# Altium footprint library THT_Bauteile.PcbLib: 59 footprints (part 3 of 4)
Each footprint in its own frame and in the unit in brackets; x right, y up, seen from the top. Pads: shape width x height; smd on the part's side, far side on the other; paste and mask are expansions set on the pad; w line width, h text height; cw(c..) or ccw(c..) is an arc to the next point about the centre after c.
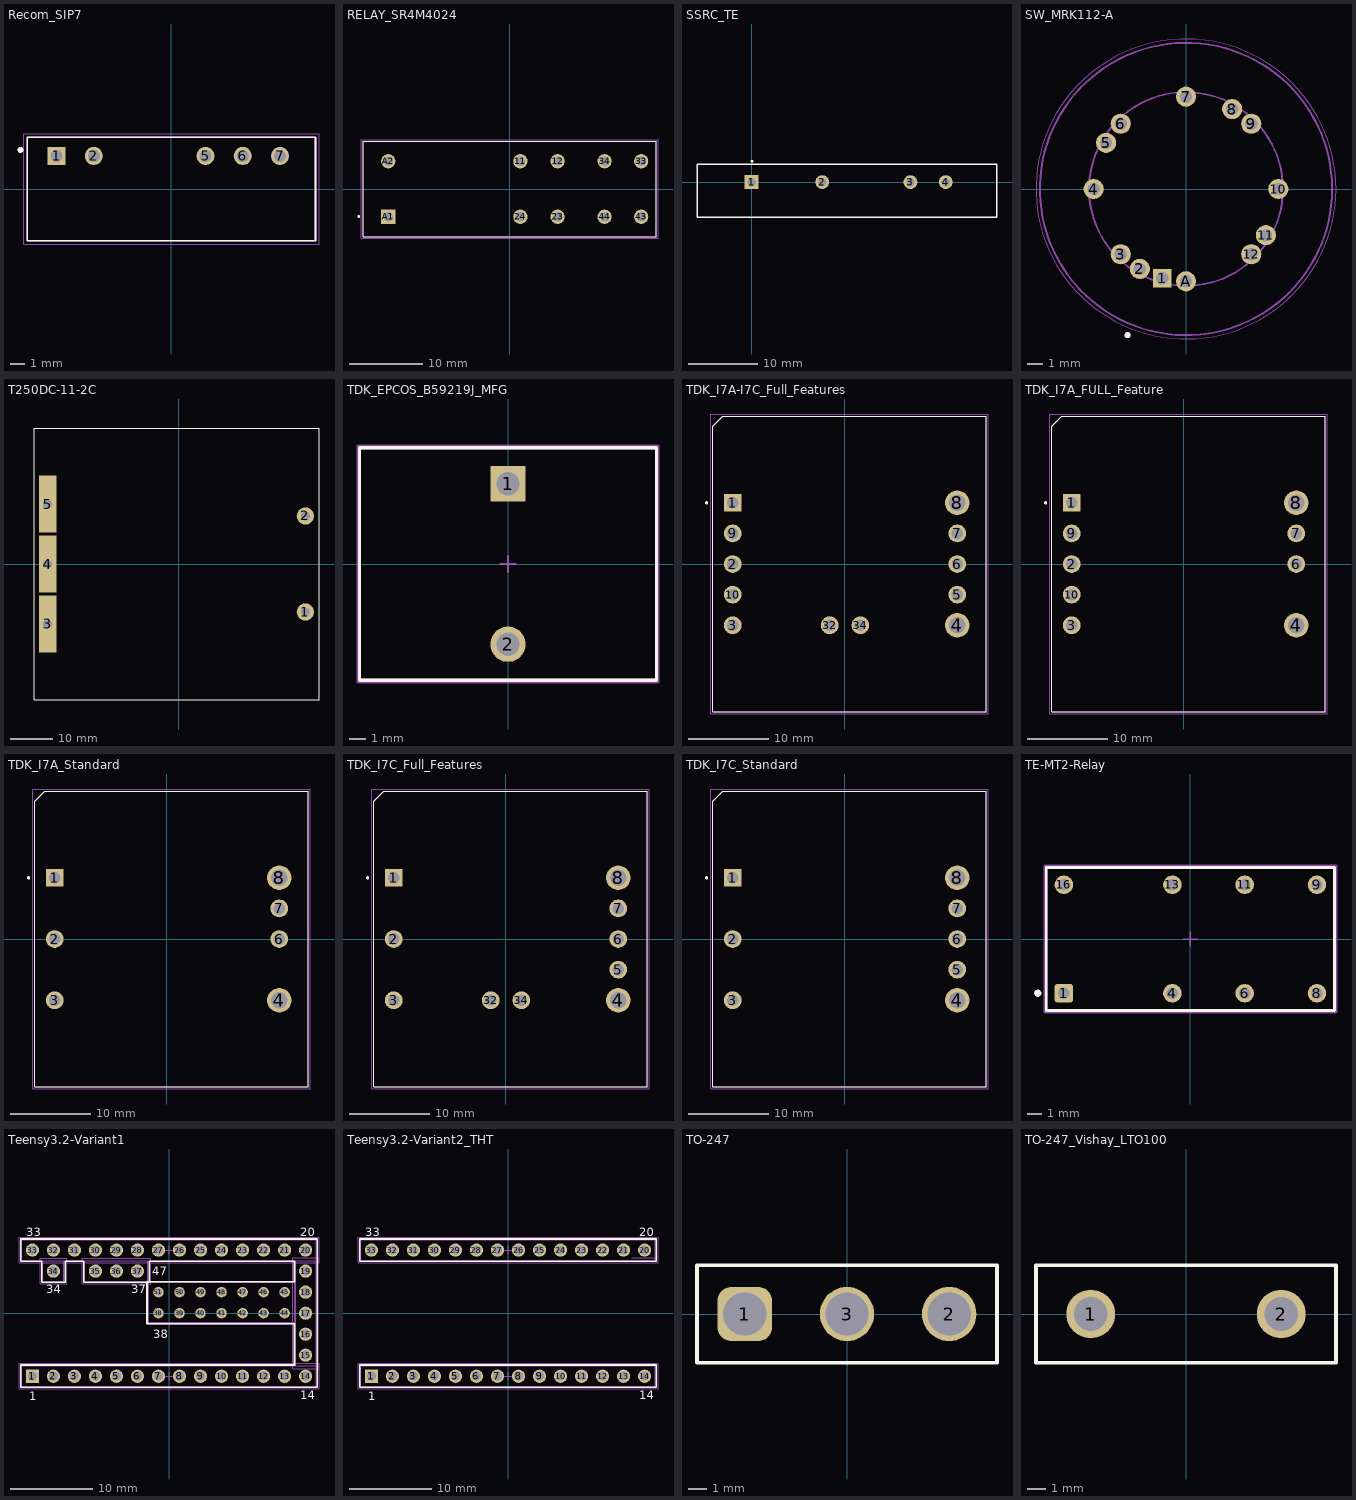
[diagram p2: the footprints below, top view; thin cyan lines are the x and y axes]

## Recom_SIP7 [mm]
height 10.2
pads (5):
  rect 1.23x1.23 hole 0.82: 1(-7.825,2.255)
  round 1.23 hole 0.82: 2(-5.285,2.255) 5(2.335,2.255) 6(4.875,2.255) 7(7.415,2.255)
Top Overlay:
  circle w0.2: c-10.287,2.667 r0.1
  lines w0.127: -9.825,-3.525 -9.825,3.525 9.825,3.525 9.825,-3.525 -9.825,-3.525
Mechanical 4:
  circle w0.2: c-10.287,2.667 r0.1
  circle w0.2: c-10.287,2.667 r0.1
  lines w0.127: -9.825,-3.525 -9.825,3.525 ; -9.825,-3.525 9.825,-3.525 ; -9.825,-3.525 -9.825,3.525 ; -9.825,-3.525 9.825,-3.525 ; -9.825,3.525 9.825,3.525 ; -9.825,3.525 9.825,3.525 ; 9.825,-3.525 9.825,3.525 ; 9.825,-3.525 9.825,3.525
Mechanical 16:
  lines w0.05: -10.075,-3.775 -10.075,3.775 10.075,3.775 10.075,-3.775 -10.075,-3.775
3D body "Recom_RKZE_D.step": height 10.2, standoff -4.1, extent -9.825,-3.525 9.825,3.525

## RELAY_SR4M4024 [mm]
pads (10):
  round 1.95 hole 1.3: 11(1.45,3.8) 12(6.54,3.8) 23(6.54,-3.8) 24(1.45,-3.8) 33(17.95,3.8) 34(12.95,3.8) 43(17.95,-3.8) 44(12.95,-3.8) A2(-16.6,3.8)
  rect 1.95x1.95 hole 1.3: A1(-16.6,-3.8)
Top Overlay:
  circle w0.2: c-20.627,-3.75 r0.1
  lines w0.127: -20,-6.5 20,-6.5 20,6.5 -20,6.5 -20,-6.5
Mechanical 13:
  lines w0.127: -20,-6.5 20,-6.5 20,6.5 -20,6.5 -20,-6.5
Mechanical 15:
  lines w0.05: -20.25,-6.75 20.25,-6.75 20.25,6.75 -20.25,6.75 -20.25,-6.75

## SSRC_TE [mm] "5A SIP Solid State Relay  With Paired SCR Output of TE"
height 26.67
pads (4):
  rect 2x2 hole 1.2: 1(0,0)
  round 2 hole 1.2: 2(10.16,0) 3(22.86,0) 4(27.94,0)
Top Overlay:
  circle w0.2: c0.025,3 r0.1
  lines w0.2: -7.875,-5.075 -7.875,2.55 35.325,2.55 35.325,-5.075 -7.875,-5.075
3D body "c-6-1393030-1-a-3d.stp": height 26.67, standoff -6.35, extent -7.874,-5.08 35.306,2.54

## SW_MRK112-A [mm]
pads (13):
  rect 1.2x1.2 hole 0.8: 1(-1.553,-5.796)
  round 1.308 hole 0.8: 2(-3,-5.196) 3(-4.243,-4.243) 4(-6,0) 5(-5.196,3) 6(-4.243,4.243) 7(0,6) 8(3,5.196) 9(4.243,4.243) 10(6,0) 11(5.196,-3) 12(4.243,-4.243) A(0,-6)
Top Overlay:
  circle w0.2: c-3.8,-9.5 r0.1
Mechanical 13:
  circle w0.127: c0,0 r6.3
  circle w0.2: c-3.8,-9.5 r0.1
  circle w0.127: c0,0 r9.5
Mechanical 15:
  circle w0.05: c0,0 r9.75
3D body "MRK112-A.stp": height 28.84, standoff -3.78, extent -9.487,-9.5 9.487,9.5

## T250DC-11-2C [mm] "Planar Transformer Footprint"
pads (5):
  round 4.1 hole 2.1: 1(30.106,-11.43) 2(30.106,11.43)
  rect 4.2x13.6 hole 2.2 square: 3(-31.193,-14.25) 4(-31.193,0) 5(-31.193,14.25)
Top Overlay:
  lines w0.2: -34.35,-32.25 -34.35,32.25 33.35,32.25 33.35,-32.25 -34.35,-32.25
3D body "63261R00-3D(04.02.24).stp": height 34, standoff -4, extent -34.348,-32.25 33.353,32.25

## TDK_EPCOS_B59219J_MFG [mm] "PTC thermistors as inrush current limiters"
height 22.7
pads (2):
  rect 2.2x2.2 hole 1.45 paste-2539.97 mask+0: 1(0,5)
  round 2.2 hole 1.45 paste-2539.97 mask+0: 2(0,-5)
Top Overlay:
  lines w0.2: -9.25,-7.25 -9.25,7.25 9.25,7.25 9.25,-7.25 -9.25,-7.25
Mechanical 10:
  lines w0.2: -9.35,-7.35 -9.35,7.35 9.35,7.35 9.35,-7.35 -9.35,-7.35
  text ".Designator" at 0,0 h1
Mechanical 12:
  lines w0.2: -9.25,-7.25 -9.25,7.25 9.25,7.25 9.25,-7.25 -9.25,-7.25
Mechanical 15:
  lines w0.1: -0.5,0 0.5,0 ; 0,-0.5 0,0.5
  lines w0.2: -9.35,-7.35 -9.35,7.35 9.35,7.35 9.35,-7.35 -9.35,-7.35
3D body "Res_EPCOS_B59219J0130A020_eec.STEP": height 0.25, standoff 0, extent -9.35,-7.35 9.35,7.35

## TDK_I7A-I7C_Full_Features [mm]
pads (12):
  rect 2.205x2.205 hole 1.47: 1(-13.97,7.615)
  round 2.205 hole 1.47: 2(-13.97,-0.005) 3(-13.97,-7.625) 5(13.97,-3.815) 6(13.97,-0.005) 7(13.97,3.805) 9(-13.97,3.805) 10(-13.97,-3.815) 32(-1.9,-7.625) 34(1.91,-7.625)
  round 3.03 hole 2.02: 4(13.97,-7.625) 8(13.97,7.615)
Top Overlay:
  circle w0.2: c-17.22,7.615 r0.1
  lines w0.127: -16.47,-18.415 -16.47,17.145 -15.2,18.415 17.57,18.415 17.57,-18.415 -16.47,-18.415
Mechanical 13:
  circle w0.2: c-17.22,7.615 r0.1
  lines w0.127: -16.47,-18.415 -16.47,17.145 -15.2,18.415 17.57,18.415 17.57,-18.415 -16.47,-18.415
Mechanical 15:
  lines w0.05: -16.72,-18.665 -16.72,18.665 17.82,18.665 17.82,-18.665 -16.72,-18.665
3D body "step_temp.STEP": height 15.24, standoff -3.68, extent -16.418,-18.415 17.618,18.415

## TDK_I7A_FULL_Feature [mm]
pads (9):
  rect 2.205x2.205 hole 1.47: 1(-13.97,7.615)
  round 2.205 hole 1.47: 2(-13.97,-0.005) 3(-13.97,-7.625) 6(13.97,-0.005) 7(13.97,3.805) 9(-13.97,3.805) 10(-13.97,-3.815)
  round 3.03 hole 2.02: 4(13.97,-7.625) 8(13.97,7.615)
Top Overlay:
  circle w0.2: c-17.22,7.615 r0.1
  lines w0.127: -16.47,-18.415 17.57,-18.415 17.57,18.415 -15.2,18.415 -16.47,17.145 -16.47,-18.415
Mechanical 13:
  circle w0.2: c-17.22,7.615 r0.1
  lines w0.127: -16.47,-18.415 17.57,-18.415 17.57,18.415 -15.2,18.415 -16.47,17.145 -16.47,-18.415
Mechanical 15:
  lines w0.05: -16.72,-18.665 17.82,-18.665 17.82,18.665 -16.72,18.665 -16.72,-18.665
3D body "step_temp.STEP": height 25.4, standoff -3.68, extent -17.018,-18.415 17.018,18.415

## TDK_I7A_Standard [mm]
pads (7):
  rect 2.205x2.205 hole 1.47: 1(-13.97,7.615)
  round 2.205 hole 1.47: 2(-13.97,-0.005) 3(-13.97,-7.625) 6(13.97,-0.005) 7(13.97,3.805)
  round 3.03 hole 2.02: 4(13.97,-7.625) 8(13.97,7.615)
Top Overlay:
  circle w0.2: c-17.22,7.615 r0.1
  lines w0.127: -16.47,-18.415 17.57,-18.415 17.57,18.415 -15.2,18.415 -16.47,17.145 -16.47,-18.415
Mechanical 13:
  circle w0.2: c-17.22,7.615 r0.1
  lines w0.127: -16.47,-18.415 17.57,-18.415 17.57,18.415 -15.2,18.415 -16.47,17.145 -16.47,-18.415
Mechanical 15:
  lines w0.05: -16.72,-18.665 17.82,-18.665 17.82,18.665 -16.72,18.665 -16.72,-18.665
3D body "step_temp.STEP": height 25.4, standoff -3.68, extent -16.436,-18.315 17.6,18.515

## TDK_I7C_Full_Features [mm]
pads (10):
  rect 2.205x2.205 hole 1.47: 1(-13.97,7.615)
  round 2.205 hole 1.47: 2(-13.97,-0.005) 3(-13.97,-7.625) 5(13.97,-3.815) 6(13.97,-0.005) 7(13.97,3.805) 32(-1.9,-7.625) 34(1.91,-7.625)
  round 3.03 hole 2.02: 4(13.97,-7.625) 8(13.97,7.615)
Top Overlay:
  circle w0.2: c-17.22,7.615 r0.1
  lines w0.127: -16.47,-18.415 -16.47,17.145 -15.2,18.415 17.57,18.415 17.57,-18.415 -16.47,-18.415
Mechanical 13:
  circle w0.2: c-17.22,7.615 r0.1
  lines w0.127: -16.47,-18.415 -16.47,17.145 -15.2,18.415 17.57,18.415 17.57,-18.415 -16.47,-18.415
Mechanical 15:
  lines w0.05: -16.72,-18.665 -16.72,18.665 17.82,18.665 17.82,-18.665 -16.72,-18.665
3D body "step_temp.STEP": height 15.24, standoff -3.68, extent -16.4,-18.515 17.636,18.315

## TDK_I7C_Standard [mm]
pads (8):
  rect 2.205x2.205 hole 1.47: 1(-13.97,7.615)
  round 2.205 hole 1.47: 2(-13.97,-0.005) 3(-13.97,-7.625) 5(13.97,-3.815) 6(13.97,-0.005) 7(13.97,3.805)
  round 3.03 hole 2.02: 4(13.97,-7.625) 8(13.97,7.615)
Top Overlay:
  circle w0.2: c-17.22,7.615 r0.1
  lines w0.127: -16.47,-18.415 -16.47,17.145 -15.2,18.415 17.57,18.415 17.57,-18.415 -16.47,-18.415
Mechanical 13:
  circle w0.2: c-17.22,7.615 r0.1
  lines w0.127: -16.47,-18.415 -16.47,17.145 -15.2,18.415 17.57,18.415 17.57,-18.415 -16.47,-18.415
Mechanical 15:
  lines w0.05: -16.72,-18.665 -16.72,18.665 17.82,18.665 17.82,-18.665 -16.72,-18.665
3D body "step_temp.STEP": height 15.24, standoff -3.68, extent -16.4,-18.515 17.636,18.315

## TE-MT2-Relay [mm]
height 10.8
pads (8):
  rrect30% 1.3x1.3 hole 0.8 paste-2539.97 mask+0: 1(-8.89,-3.81)
  round 1.3 hole 0.8 paste-2539.97 mask+0: 4(-1.27,-3.81) 6(3.81,-3.81) 8(8.89,-3.81) 9(8.89,3.81) 11(3.81,3.81) 13(-1.27,3.81) 16(-8.89,3.81)
Top Overlay:
  circle w0.25: c-10.725,-3.81 r0.125
  lines w0.2: -10.125,-5.025 10.125,-5.025 10.125,5.025 -10.125,5.025 -10.125,-5.025
Top 3D Body:
  lines w0.2: -10.125,-5.025 10.125,-5.025 10.125,5.025 -10.125,5.025 -10.125,-5.025
Top Assembly:
  lines w0.2: -10.225,-5.125 10.225,-5.125 10.225,5.125 -10.225,5.125 -10.225,-5.125
  text ".Designator" at 0,0.188 h1
Top Courtyard:
  lines w0.2: -10.225,-5.125 10.225,-5.125 10.225,5.125 -10.225,5.125 -10.225,-5.125
Top Component Center:
  lines w0.1: -0.5,0 0.5,0 ; 0,-0.5 0,0.5
3D body "Relay_TE_Connectivity_1-1462000-3_eec.STEP": height 0.25, standoff 0, extent -10.225,-5.125 10.225,5.125

## Teensy3.2-Variant1 [mm]
pads (51):
  rect 1.6x1.6 hole 1.1: 1(-16.51,-7.62)
  round 1.6 hole 1.1: 2(-13.97,-7.62) 3(-11.43,-7.62) 4(-8.89,-7.62) 5(-6.35,-7.62) 6(-3.81,-7.62) 7(-1.27,-7.62) 8(1.27,-7.62) 9(3.81,-7.62) 10(6.35,-7.62) 11(8.89,-7.62) 12(11.43,-7.62) 13(13.97,-7.62) 14(16.51,-7.62) 15(16.51,-5.08) 16(16.51,-2.54) 17(16.51,0) 18(16.51,2.54) 19(16.51,5.08) 20(16.51,7.62) 21(13.97,7.62) 22(11.43,7.62) 23(8.89,7.62) 24(6.35,7.62) 25(3.81,7.62) 26(1.27,7.62) 27(-1.27,7.62) 28(-3.81,7.62) 29(-6.35,7.62) 30(-8.89,7.62) 31(-11.43,7.62) 32(-13.97,7.62) 33(-16.51,7.62) 34(-13.97,5.08) 35(-8.89,5.08) 36(-6.35,5.08) 37(-3.81,5.08)
  round 1.27 hole 0.864 mask+0.076: 38(-1.27,0) 39(1.27,0) 40(3.81,0) 41(6.35,0) 42(8.89,0) 43(11.43,0) 44(13.97,0) 45(13.97,2.54) 46(11.43,2.54) 47(8.89,2.54) 48(6.35,2.54) 49(3.81,2.54) 50(1.27,2.54) 51(-1.27,2.54)
Top Overlay:
  lines w0.2: -17.93,-8.965 17.93,-8.965 17.93,8.965 -17.93,8.965 -17.93,6.275 -15.39,6.275 -15.39,3.735 -12.55,3.735 -12.55,6.275 -10.31,6.275 -10.31,3.735 -2.39,3.735 -2.39,6.275 15.165,6.275 15.165,3.81 -2.667,3.81 -2.667,-1.27 15.165,-1.27 15.165,-6.275 -17.93,-6.275 -17.93,-8.965
  text "37" at -4.572,2.413 h1.02
  text "34" at -14.859,2.413 h1.02
  text "20" at 15.88,9.32 h1.02
  text "33" at -17.272,9.271 h1.02
  text "1" at -16.891,-10.541 h1.02
  text "47" at -2.032,4.572 h1.02
  text "38" at -1.905,-3.048 h1.02
  text "14" at 15.875,-10.414 h1.02
Mechanical 1:
  lines w0.254: -2.54,-1.219 15.24,-1.219 15.24,3.759 -2.54,3.759 -2.54,-1.219
Mechanical 13:
  lines w0.1: 17.78,-6.35 17.78,-8.89 -17.78,-8.89 -17.78,-6.35 17.78,-6.35 ; 17.78,-6.35 15.24,-6.35 15.24,6.35 17.78,6.35 ; 17.78,-6.35 17.78,6.35 ; 17.78,6.35 17.78,8.89 -17.78,8.89 -17.78,6.35 17.78,6.35 ; -15.24,3.81 -15.24,6.35 -12.7,6.35 -12.7,3.81 -15.24,3.81 ; -10.16,3.81 -2.54,3.81 -2.54,6.35 -10.16,6.35 -10.16,3.81
Mechanical 15:
  lines w0.05: -14.47,5.08 -13.47,5.08 ; -13.97,4.58 -13.97,5.58 ; -6.85,5.08 -5.85,5.08 ; -6.35,4.58 -6.35,5.58 ; -0.5,-7.62 0.5,-7.62 ; -0.5,7.62 0.5,7.62 ; 0,-8.12 0,-7.12 ; 0,7.12 0,8.12 ; 16.01,0 17.01,0 ; 16.51,-0.5 16.51,0.5 ; -18.13,-9.165 -18.13,-6.075 18.13,-6.075 18.13,-9.165 -18.13,-9.165 ; -18.13,6.075 -18.13,9.165 18.13,9.165 18.13,6.075 -18.13,6.075 ; -15.59,3.535 -15.59,6.625 -12.35,6.625 -12.35,3.535 -15.59,3.535 ; -10.51,3.535 -2.19,3.535 -2.19,6.625 -10.51,6.625 -10.51,3.535 ; 14.965,-6.7 14.965,6.7 18.055,6.7 18.055,-6.7 14.965,-6.7
3D body "61301411121.stp": height 8.57, standoff -2.97, extent -17.78,6.35 17.78,8.89
3D body "61301411121.stp": height 8.57, standoff -2.97, extent -17.78,-8.89 17.78,-6.35
3D body "61300511121.stp": height 8.57, standoff -2.97, extent 15.24,-6.35 17.78,6.35
3D body "61300311121.stp": height 8.57, standoff -2.97, extent -10.16,3.81 -2.54,6.35
3D body "61300111121.stp": height 8.57, standoff -2.97, extent -15.24,3.81 -12.7,6.35
3D body "SLW-107-01-F-D.stp": height 4.57, standoff -2.92, extent -2.54,-1.156 15.24,3.797

## Teensy3.2-Variant2_THT [mm]
pads (28):
  rect 1.6x1.6 hole 1.1: 1(-16.51,-7.62)
  round 1.6 hole 1.1: 2(-13.97,-7.62) 3(-11.43,-7.62) 4(-8.89,-7.62) 5(-6.35,-7.62) 6(-3.81,-7.62) 7(-1.27,-7.62) 8(1.27,-7.62) 9(3.81,-7.62) 10(6.35,-7.62) 11(8.89,-7.62) 12(11.43,-7.62) 13(13.97,-7.62) 14(16.51,-7.62) 20(16.51,7.62) 21(13.97,7.62) 22(11.43,7.62) 23(8.89,7.62) 24(6.35,7.62) 25(3.81,7.62) 26(1.27,7.62) 27(-1.27,7.62) 28(-3.81,7.62) 29(-6.35,7.62) 30(-8.89,7.62) 31(-11.43,7.62) 32(-13.97,7.62) 33(-16.51,7.62)
Top Overlay:
  lines w0.2: -17.93,-8.965 17.93,-8.965 17.93,-6.275 -17.93,-6.275 -17.93,-8.965 ; -17.93,6.275 17.93,6.275 17.93,8.965 -17.93,8.965 -17.93,6.275
  text "20" at 15.88,9.32 h1.02
  text "33" at -17.272,9.271 h1.02
  text "1" at -16.891,-10.541 h1.02
  text "14" at 15.875,-10.414 h1.02
Mechanical 13:
  lines w0.1: -15.24,6.35 -12.7,6.35 ; -10.16,6.35 -2.54,6.35 ; 15.24,-6.35 17.78,-6.35 ; 15.24,6.35 17.78,6.35 ; 17.78,-6.35 17.78,-8.89 -17.78,-8.89 -17.78,-6.35 17.78,-6.35 ; 17.78,6.35 17.78,8.89 -17.78,8.89 -17.78,6.35 17.78,6.35
Mechanical 15:
  lines w0.05: -0.5,-7.62 0.5,-7.62 ; -0.5,7.62 0.5,7.62 ; 0,-8.12 0,-7.12 ; 0,7.12 0,8.12 ; 14.965,6.7 18.055,6.7 ; -18.13,-9.165 -18.13,-6.075 18.13,-6.075 18.13,-9.165 -18.13,-9.165 ; -18.13,6.075 -18.13,9.165 18.13,9.165 18.13,6.075 -18.13,6.075
3D body "61301411121.stp": height 8.57, standoff -2.97, extent -17.78,6.35 17.78,8.89
3D body "61301411121.stp": height 8.57, standoff -2.97, extent -17.78,-8.89 17.78,-6.35

## TO-247 [mm]
pads (3):
  rrect50% 2.9x2.9 hole 2.3: 1(-5.45,0)
  round 2.9 hole 2.3: 2(5.45,0) 3(0,0)
Top Overlay:
  lines w0.2: -8,-2.6 8,-2.6 8,2.6 -8,2.6 -8,-2.6
3D body "Infineon-TO-247-3.STEP": height 10, standoff -25.1, extent -7.775,-2.525 7.825,2.475

## TO-247_Vishay_LTO100 [mm]
pads (2):
  round 2.6 hole 1.8: 1(-5.08,0) 2(5.08,0)
Top Overlay:
  lines w0.2: -8,-2.6 -8,2.6 8,2.6 8,-2.6 -8,-2.6
3D body "52339411 LTO100.stp": height 24.35, standoff -10.85, extent -7.88,-2.66 7.88,2.54